# Altium footprint library CPU_STM_080816.PcbLib: 220 footprints (part 8 of 16)
Each footprint in its own frame and in the unit in brackets; x right, y up, seen from the top. Pads: shape width x height; smd on the part's side, far side on the other; paste and mask are expansions set on the pad; w line width, h text height; cw(c..) or ccw(c..) is an arc to the next point about the centre after c.
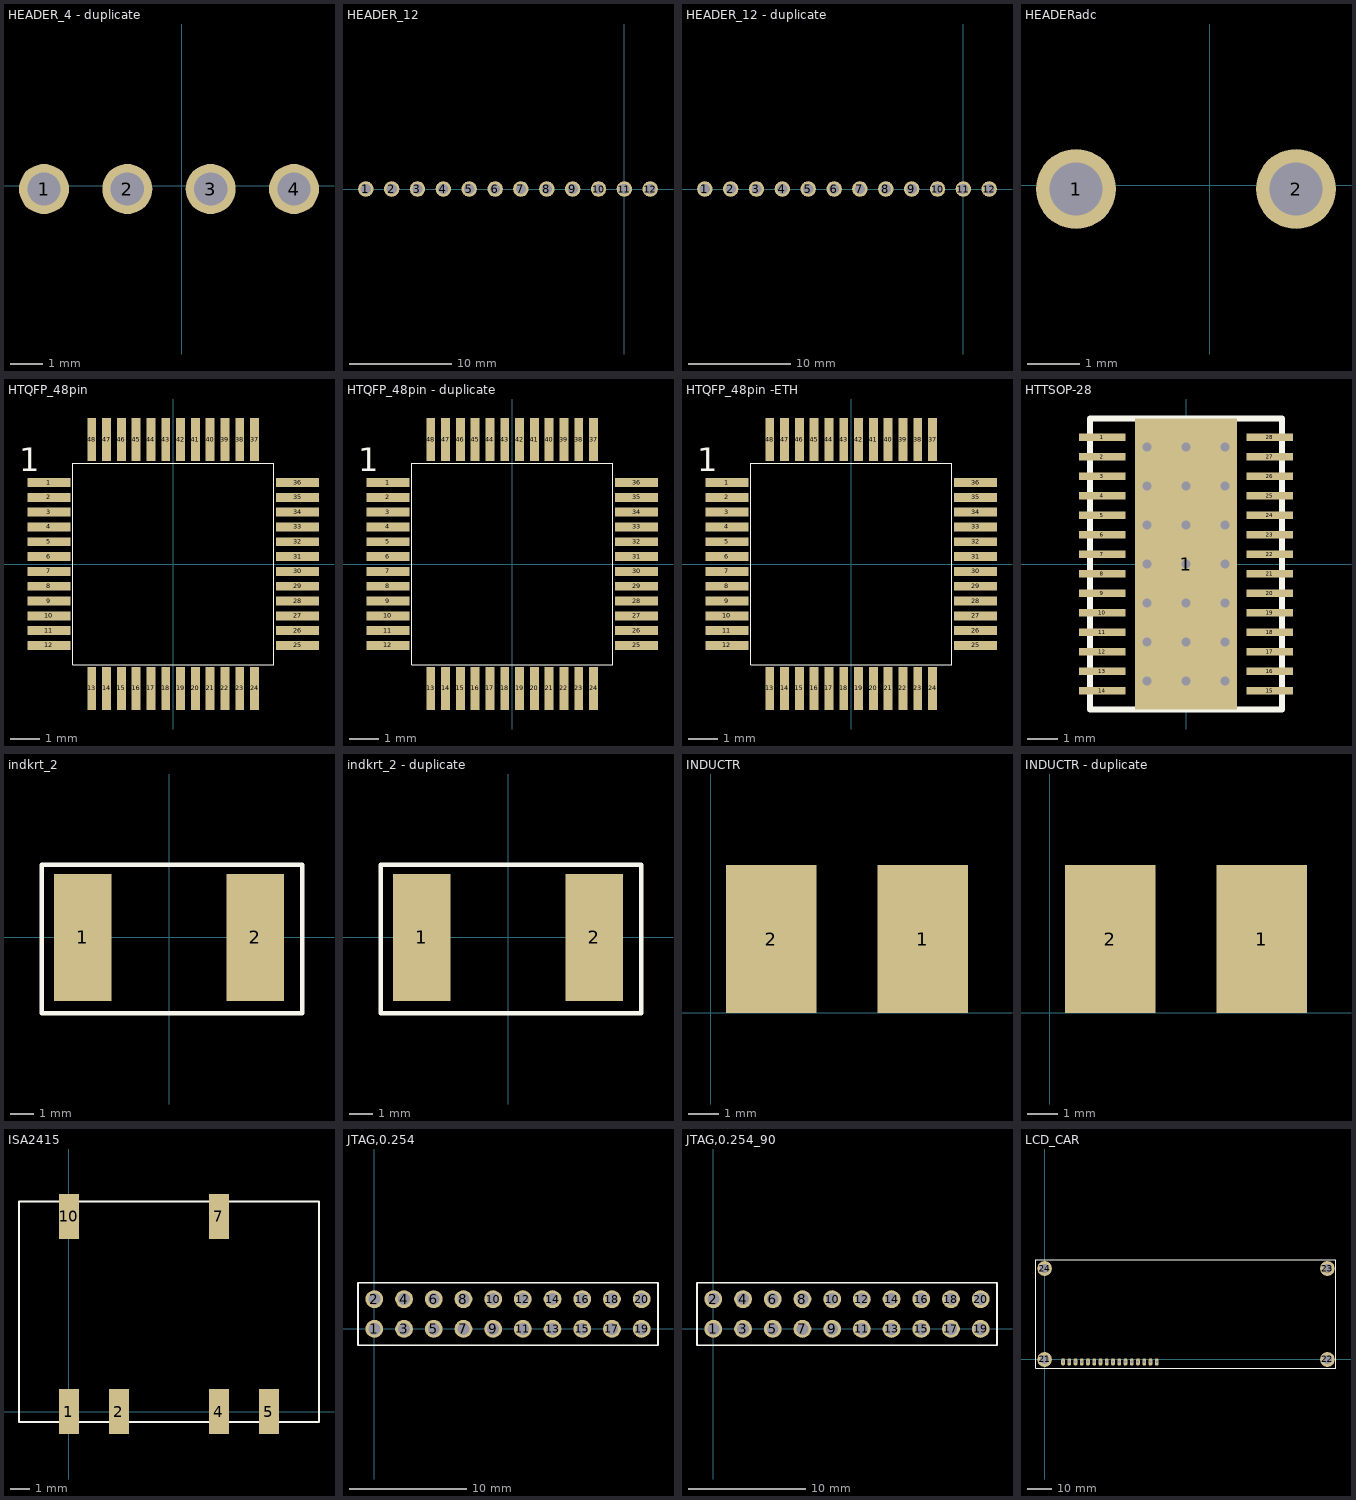
[diagram p7: the footprints below, top view; thin cyan lines are the x and y axes]

## HEADER_4 - duplicate [mil]
pads (4):
  round 60 hole 40: 1(-165,-4) 2(-65,-4) 3(35,-4) 4(135,-4)

## HEADER_12 [mil]
pads (12):
  round 60 hole 40: 1(-1000,0) 2(-900,0) 3(-800,0) 4(-700,0) 5(-600,0) 6(-500,0) 7(-400,0) 8(-300,0) 9(-200,0) 10(-100,0) 11(0,0) 12(100,0)

## HEADER_12 - duplicate [mil]
pads (12):
  round 60 hole 40: 1(-1000,0) 2(-900,0) 3(-800,0) 4(-700,0) 5(-600,0) 6(-500,0) 7(-400,0) 8(-300,0) 9(-200,0) 10(-100,0) 11(0,0) 12(100,0)

## HEADERadc [mil]
pads (2):
  round 60 hole 40: 1(-100.39,-2.95) 2(64.61,-2.95)

## HTQFP_48pin [mm] "HTQFP_48PIN"
pads (48):
  rect 1.45x0.3 smd mask+0.2: 1(-4.2,2.75) 2(-4.2,2.25) 3(-4.2,1.75) 4(-4.2,1.25) 5(-4.2,0.75) 6(-4.2,0.25) 7(-4.2,-0.25) 8(-4.2,-0.75) 9(-4.2,-1.25) 10(-4.2,-1.75) 11(-4.2,-2.25) 12(-4.2,-2.75) 25(4.2,-2.75) 26(4.2,-2.25) 27(4.2,-1.75) 28(4.2,-1.25) 29(4.2,-0.75) 30(4.2,-0.25) 31(4.2,0.25) 32(4.2,0.75) 33(4.2,1.25) 34(4.2,1.75) 35(4.2,2.25) 36(4.2,2.75)
  rect 0.3x1.45 smd mask+0.2: 13(-2.75,-4.2) 14(-2.25,-4.2) 15(-1.75,-4.2) 16(-1.25,-4.2) 17(-0.75,-4.2) 18(-0.25,-4.2) 19(0.25,-4.2) 20(0.75,-4.2) 21(1.25,-4.2) 22(1.75,-4.2) 23(2.25,-4.2) 24(2.75,-4.2) 37(2.75,4.2) 38(2.25,4.2) 39(1.75,4.2) 40(1.25,4.2) 41(0.75,4.2) 42(0.25,4.2) 43(-0.25,4.2) 44(-0.75,4.2) 45(-1.25,4.2) 46(-1.75,4.2) 47(-2.25,4.2) 48(-2.75,4.2)
Top Overlay:
  lines w0.025: -3.4,-3.4 3.4,-3.4 3.4,3.4 -3.4,3.4 -3.4,-3.4
  text "1" at -5.207,3.124 h0.79

## HTQFP_48pin - duplicate [mm] "HTQFP_48PIN"
pads (48):
  rect 1.45x0.3 smd mask+0.2: 1(-4.2,2.75) 2(-4.2,2.25) 3(-4.2,1.75) 4(-4.2,1.25) 5(-4.2,0.75) 6(-4.2,0.25) 7(-4.2,-0.25) 8(-4.2,-0.75) 9(-4.2,-1.25) 10(-4.2,-1.75) 11(-4.2,-2.25) 12(-4.2,-2.75) 25(4.2,-2.75) 26(4.2,-2.25) 27(4.2,-1.75) 28(4.2,-1.25) 29(4.2,-0.75) 30(4.2,-0.25) 31(4.2,0.25) 32(4.2,0.75) 33(4.2,1.25) 34(4.2,1.75) 35(4.2,2.25) 36(4.2,2.75)
  rect 0.3x1.45 smd mask+0.2: 13(-2.75,-4.2) 14(-2.25,-4.2) 15(-1.75,-4.2) 16(-1.25,-4.2) 17(-0.75,-4.2) 18(-0.25,-4.2) 19(0.25,-4.2) 20(0.75,-4.2) 21(1.25,-4.2) 22(1.75,-4.2) 23(2.25,-4.2) 24(2.75,-4.2) 37(2.75,4.2) 38(2.25,4.2) 39(1.75,4.2) 40(1.25,4.2) 41(0.75,4.2) 42(0.25,4.2) 43(-0.25,4.2) 44(-0.75,4.2) 45(-1.25,4.2) 46(-1.75,4.2) 47(-2.25,4.2) 48(-2.75,4.2)
Top Overlay:
  lines w0.025: -3.4,-3.4 -3.4,3.4 3.4,3.4 3.4,-3.4 -3.4,-3.4
  text "1" at -5.207,3.124 h0.79

## HTQFP_48pin -ETH [mm] "HTQFP_48PIN"
pads (48):
  rect 1.45x0.3 smd mask+0.2: 1(-4.2,2.75) 2(-4.2,2.25) 3(-4.2,1.75) 4(-4.2,1.25) 5(-4.2,0.75) 6(-4.2,0.25) 7(-4.2,-0.25) 8(-4.2,-0.75) 9(-4.2,-1.25) 10(-4.2,-1.75) 11(-4.2,-2.25) 12(-4.2,-2.75) 25(4.2,-2.75) 26(4.2,-2.25) 27(4.2,-1.75) 28(4.2,-1.25) 29(4.2,-0.75) 30(4.2,-0.25) 31(4.2,0.25) 32(4.2,0.75) 33(4.2,1.25) 34(4.2,1.75) 35(4.2,2.25) 36(4.2,2.75)
  rect 0.3x1.45 smd mask+0.2: 13(-2.75,-4.2) 14(-2.25,-4.2) 15(-1.75,-4.2) 16(-1.25,-4.2) 17(-0.75,-4.2) 18(-0.25,-4.2) 19(0.25,-4.2) 20(0.75,-4.2) 21(1.25,-4.2) 22(1.75,-4.2) 23(2.25,-4.2) 24(2.75,-4.2) 37(2.75,4.2) 38(2.25,4.2) 39(1.75,4.2) 40(1.25,4.2) 41(0.75,4.2) 42(0.25,4.2) 43(-0.25,4.2) 44(-0.75,4.2) 45(-1.25,4.2) 46(-1.75,4.2) 47(-2.25,4.2) 48(-2.75,4.2)
Top Overlay:
  lines w0.025: -3.4,-3.4 3.4,-3.4 3.4,3.4 -3.4,3.4 -3.4,-3.4
  text "1" at -5.207,3.124 h0.79
3D body "User Library-LQFP48-7x7-0_50.step": height 1.4, standoff -0.05, extent -4.5,-4.5 4.5,4.5

## HTTSOP-28 [mm]
pads (29):
  rect 1.55x0.25 smd: 1(-2.8,4.225) 2(-2.8,3.575) 3(-2.8,2.925) 4(-2.8,2.275) 5(-2.8,1.625) 6(-2.8,0.975) 7(-2.8,0.325) 8(-2.8,-0.325) 9(-2.8,-0.975) 10(-2.8,-1.625) 11(-2.8,-2.275) 12(-2.8,-2.925) 13(-2.8,-3.575) 14(-2.8,-4.225) 15(2.8,-4.225) 16(2.8,-3.575) 17(2.8,-2.925) 18(2.8,-2.275) 19(2.8,-1.625) 20(2.8,-0.975) 21(2.8,-0.325) 22(2.8,0.325) 23(2.8,0.975) 24(2.8,1.625) 25(2.8,2.275) 26(2.8,2.925) 27(2.8,3.575) 28(2.8,4.225)
  rect 3.4x9.7 all layers, no hole: 1(0,0)
via 0,3.9 diameter 0.6 hole 0.3
via -1.3,3.9 diameter 0.6 hole 0.3
via 1.3,3.9 diameter 0.6 hole 0.3
via 1.3,3.9 diameter 0.6 hole 0.3
via -1.3,3.9 diameter 0.6 hole 0.3
via 0,3.9 diameter 0.6 hole 0.3
via 0,3.9 diameter 0.6 hole 0.3
via -1.3,3.9 diameter 0.6 hole 0.3
via 1.3,3.9 diameter 0.6 hole 0.3
via 1.3,3.9 diameter 0.6 hole 0.3
via -1.3,3.9 diameter 0.6 hole 0.3
via 0,3.9 diameter 0.6 hole 0.3
via 0,3.9 diameter 0.6 hole 0.3
via -1.3,3.9 diameter 0.6 hole 0.3
via 1.3,3.9 diameter 0.6 hole 0.3
via 1.3,3.9 diameter 0.6 hole 0.3
via -1.3,3.9 diameter 0.6 hole 0.3
via 0,3.9 diameter 0.6 hole 0.3
via 0,2.6 diameter 0.6 hole 0.3
via -1.3,2.6 diameter 0.6 hole 0.3
via 1.3,2.6 diameter 0.6 hole 0.3
via 1.3,2.6 diameter 0.6 hole 0.3
via -1.3,2.6 diameter 0.6 hole 0.3
via 0,2.6 diameter 0.6 hole 0.3
via 0,2.6 diameter 0.6 hole 0.3
via -1.3,2.6 diameter 0.6 hole 0.3
via 1.3,2.6 diameter 0.6 hole 0.3
via 1.3,2.6 diameter 0.6 hole 0.3
via -1.3,2.6 diameter 0.6 hole 0.3
via 0,2.6 diameter 0.6 hole 0.3
via 0,2.6 diameter 0.6 hole 0.3
via -1.3,2.6 diameter 0.6 hole 0.3
via 1.3,2.6 diameter 0.6 hole 0.3
via 1.3,2.6 diameter 0.6 hole 0.3
via -1.3,2.6 diameter 0.6 hole 0.3
via 0,2.6 diameter 0.6 hole 0.3
via 0,1.3 diameter 0.6 hole 0.3
via -1.3,1.3 diameter 0.6 hole 0.3
via 1.3,1.3 diameter 0.6 hole 0.3
via 1.3,1.3 diameter 0.6 hole 0.3
via -1.3,1.3 diameter 0.6 hole 0.3
via 0,1.3 diameter 0.6 hole 0.3
via 0,1.3 diameter 0.6 hole 0.3
via -1.3,1.3 diameter 0.6 hole 0.3
via 1.3,1.3 diameter 0.6 hole 0.3
via 1.3,1.3 diameter 0.6 hole 0.3
via -1.3,1.3 diameter 0.6 hole 0.3
via 0,1.3 diameter 0.6 hole 0.3
via 0,1.3 diameter 0.6 hole 0.3
via -1.3,1.3 diameter 0.6 hole 0.3
via 1.3,1.3 diameter 0.6 hole 0.3
via 1.3,1.3 diameter 0.6 hole 0.3
via -1.3,1.3 diameter 0.6 hole 0.3
via 0,1.3 diameter 0.6 hole 0.3
via 0,0 diameter 0.6 hole 0.3
via -1.3,0 diameter 0.6 hole 0.3
via 1.3,0 diameter 0.6 hole 0.3
via 1.3,0 diameter 0.6 hole 0.3
via -1.3,0 diameter 0.6 hole 0.3
via 0,0 diameter 0.6 hole 0.3
via 0,0 diameter 0.6 hole 0.3
via -1.3,0 diameter 0.6 hole 0.3
via 1.3,0 diameter 0.6 hole 0.3
via 1.3,0 diameter 0.6 hole 0.3
via -1.3,0 diameter 0.6 hole 0.3
via 0,0 diameter 0.6 hole 0.3
via 0,0 diameter 0.6 hole 0.3
via -1.3,0 diameter 0.6 hole 0.3
via 1.3,0 diameter 0.6 hole 0.3
via 1.3,0 diameter 0.6 hole 0.3
via -1.3,0 diameter 0.6 hole 0.3
via 0,0 diameter 0.6 hole 0.3
via 0,-1.3 diameter 0.6 hole 0.3
via -1.3,-1.3 diameter 0.6 hole 0.3
via 1.3,-1.3 diameter 0.6 hole 0.3
via 1.3,-1.3 diameter 0.6 hole 0.3
via -1.3,-1.3 diameter 0.6 hole 0.3
via 0,-1.3 diameter 0.6 hole 0.3
via 0,-1.3 diameter 0.6 hole 0.3
via -1.3,-1.3 diameter 0.6 hole 0.3
via 1.3,-1.3 diameter 0.6 hole 0.3
via 1.3,-1.3 diameter 0.6 hole 0.3
via -1.3,-1.3 diameter 0.6 hole 0.3
via 0,-1.3 diameter 0.6 hole 0.3
via 0,-1.3 diameter 0.6 hole 0.3
via -1.3,-1.3 diameter 0.6 hole 0.3
via 1.3,-1.3 diameter 0.6 hole 0.3
via 1.3,-1.3 diameter 0.6 hole 0.3
via -1.3,-1.3 diameter 0.6 hole 0.3
via 0,-1.3 diameter 0.6 hole 0.3
via 0,-2.6 diameter 0.6 hole 0.3
via -1.3,-2.6 diameter 0.6 hole 0.3
via 1.3,-2.6 diameter 0.6 hole 0.3
via 1.3,-2.6 diameter 0.6 hole 0.3
via -1.3,-2.6 diameter 0.6 hole 0.3
via 0,-2.6 diameter 0.6 hole 0.3
via 0,-2.6 diameter 0.6 hole 0.3
via -1.3,-2.6 diameter 0.6 hole 0.3
via 1.3,-2.6 diameter 0.6 hole 0.3
via 1.3,-2.6 diameter 0.6 hole 0.3
via -1.3,-2.6 diameter 0.6 hole 0.3
via 0,-2.6 diameter 0.6 hole 0.3
via 0,-2.6 diameter 0.6 hole 0.3
via -1.3,-2.6 diameter 0.6 hole 0.3
via 1.3,-2.6 diameter 0.6 hole 0.3
via 1.3,-2.6 diameter 0.6 hole 0.3
via -1.3,-2.6 diameter 0.6 hole 0.3
via 0,-2.6 diameter 0.6 hole 0.3
via 0,-3.9 diameter 0.6 hole 0.3
via -1.3,-3.9 diameter 0.6 hole 0.3
via 1.3,-3.9 diameter 0.6 hole 0.3
via 1.3,-3.9 diameter 0.6 hole 0.3
via -1.3,-3.9 diameter 0.6 hole 0.3
via 0,-3.9 diameter 0.6 hole 0.3
via 0,-3.9 diameter 0.6 hole 0.3
via -1.3,-3.9 diameter 0.6 hole 0.3
via 1.3,-3.9 diameter 0.6 hole 0.3
via 1.3,-3.9 diameter 0.6 hole 0.3
via -1.3,-3.9 diameter 0.6 hole 0.3
via 0,-3.9 diameter 0.6 hole 0.3
via 0,-3.9 diameter 0.6 hole 0.3
via -1.3,-3.9 diameter 0.6 hole 0.3
via 1.3,-3.9 diameter 0.6 hole 0.3
via 1.3,-3.9 diameter 0.6 hole 0.3
via -1.3,-3.9 diameter 0.6 hole 0.3
via 0,-3.9 diameter 0.6 hole 0.3
Top Overlay:
  lines w0.2: -3.2,-4.85 -3.2,4.85 3.2,4.85 3.2,-4.85 -3.2,-4.85
3D body "SW3dPS-TSSOP-28_P065.STEP": height 1.09, standoff 0.01, extent -3.199,-4.85 3.214,4.85

## indkrt_2 [mil]
pads (2):
  rect 95x210 smd: 1(-142.5,0) 2(142.5,0)
Top Overlay:
  lines w7.87: -210,-125 -210,-26.57 -210,120 220,120 220,-125 -210,-125

## indkrt_2 - duplicate [mil]
pads (2):
  rect 95x210 smd: 1(-142.5,0) 2(142.5,0)
Top Overlay:
  lines w7.87: -210,-125 220,-125 220,120 -210,120 -210,-26.57 -210,-125

## INDUCTR [mm]
pads (2):
  rect 3x4.9 smd: 1(7,2.44) 2(2,2.44)

## INDUCTR - duplicate [mm]
pads (2):
  rect 3x4.9 smd: 1(7,2.44) 2(2,2.44)

## ISA2415 [mm] "DC DC Converter"
pads (6):
  rect 1x2.29 smd: 1(0,0) 2(2.54,0) 4(7.62,0) 5(10.16,0) 7(7.62,9.91) 10(0,9.91)
Top Overlay:
  lines w0.1: -2.54,-0.52 -2.54,10.68 12.7,10.68 12.7,-0.52 -2.54,-0.52
  text "." at -1.27,2.032 h2
3D body "pqm1-s5-s3-m.stp": height 7.15, standoff -0.1, extent -2.54,-0.52 12.7,10.68

## JTAG,0.254 [mil]
pads (20):
  round 60 hole 40: 1(0,0) 2(0,100) 3(100,0) 4(100,100) 5(200,0) 6(200,100) 7(300,0) 8(300,100) 9(400,0) 10(400,100) 11(500,0) 12(500,100) 13(600,0) 14(600,100) 15(700,0) 16(700,100) 17(800,0) 18(800,100) 19(900,0) 20(900,100)
Top Overlay:
  lines w6: -55,-55 -55,155 955,155 955,-55 -55,-55
3D body "Header 2X10.STEP": height 322.18, standoff -110.89, extent -50,-50 950,150

## JTAG,0.254_90 [mil]
pads (20):
  round 60 hole 40: 1(0,0) 2(0,100) 3(100,0) 4(100,100) 5(200,0) 6(200,100) 7(300,0) 8(300,100) 9(400,0) 10(400,100) 11(500,0) 12(500,100) 13(600,0) 14(600,100) 15(700,0) 16(700,100) 17(800,0) 18(800,100) 19(900,0) 20(900,100)
Top Overlay:
  lines w6: -55,-55 955,-55 955,155 -55,155 -55,-55
3D body "header_90.stp": height 196.85, standoff -147.64, extent -51.18,-13.98 948.82,476.38

## LCD_CAR [mm]
pads (20):
  oval 1.524x3 hole 1.016: 1(40.5,-1) 2(37.96,-1) 3(35.42,-1) 4(32.88,-1) 5(30.34,-1) 6(27.8,-1) 7(25.26,-1) 8(22.72,-1) 9(20.18,-1) 10(17.64,-1) 11(15.1,-1) 12(12.56,-1) 13(10.02,-1) 14(7.48,-1) 15(43.04,-1) 16(45.58,-1)
  round 6 hole 3.6: 21(0,0) 22(115,0) 23(115,37) 24(0,37)
Top Overlay:
  lines w0.2: -3.5,-3.5 -3.5,-1 -3.5,40.5 115,40.5 118.5,40.5 118.5,0 118.5,-3.5 12.56,-3.5 -3.5,-3.5
3D body "RC1602E.step": height 31.6, standoff 18.5, extent -3.7,-3.65 118.8,40.85